# Altium schematic symbol library CUSTOM SCH - Copy.SchLib: 494 symbols (part 2 of 6)
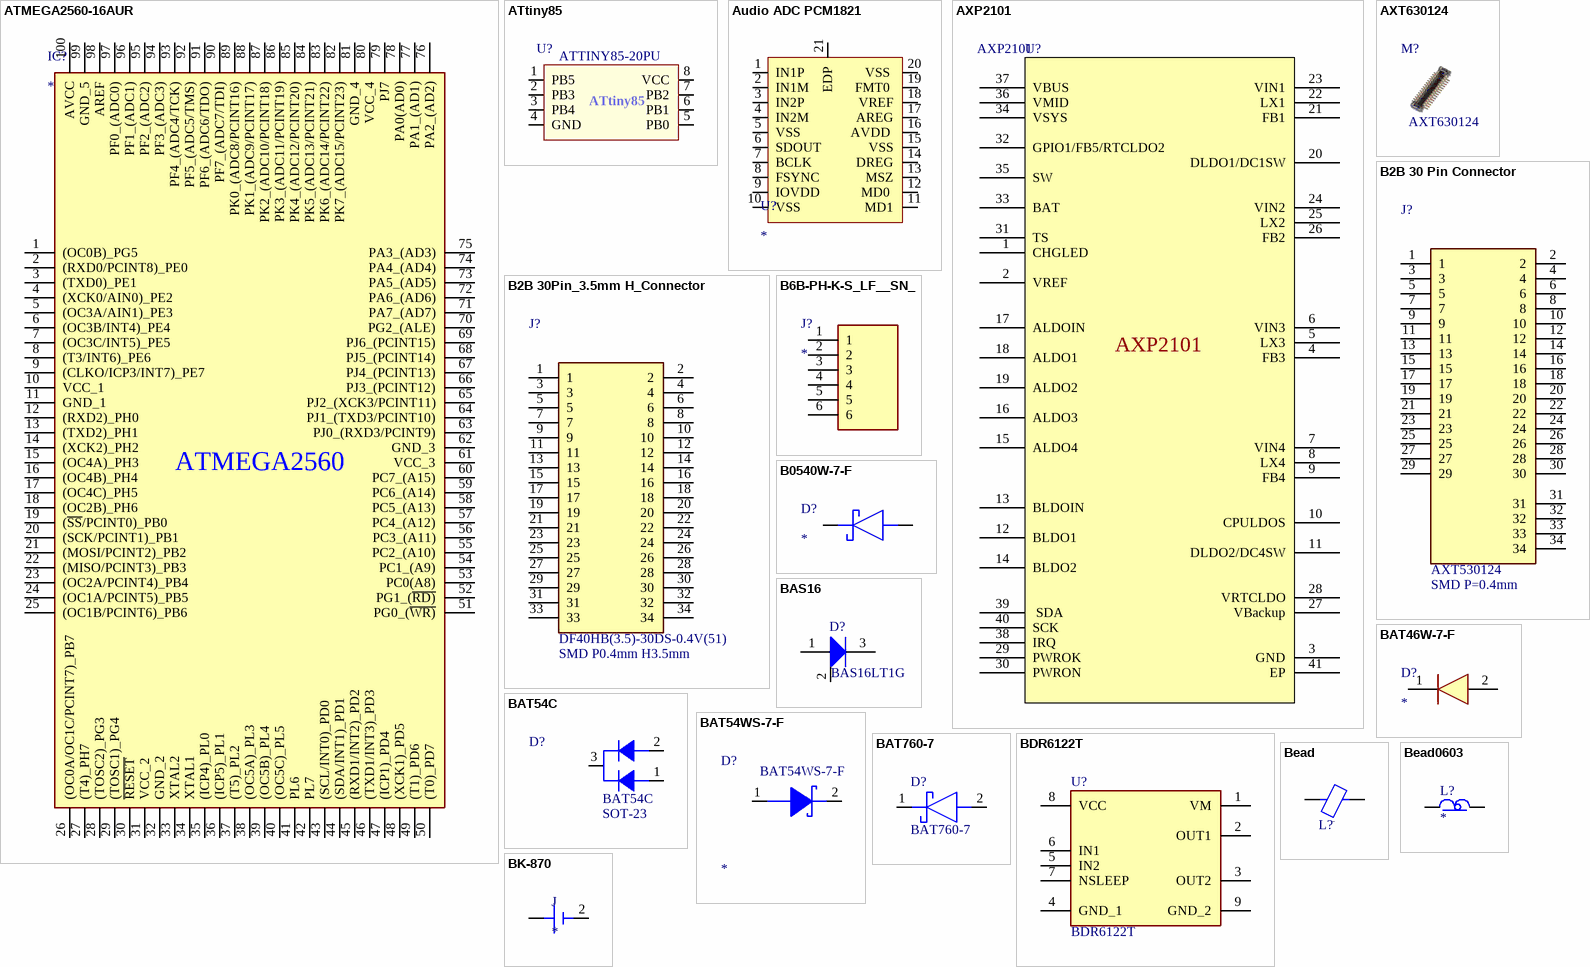
[diagram p50: symbols ATMEGA2560-16AUR to BK-870]

## BAT54WS-7-F
designator D?  Manufacturer Part Number: BAT54WS-7-F
Manufacturer: Multicomp; Max Repetitive Reverse Voltage (Vrrm): 30V; Forward Current: 200mA; Reverse Recovery Time: 5ns; Element Configuration: Single; Forward Voltage: 1V; Max Forward Surge Current (Ifsm): 600mA; Supplier 1: Newark; Stock 1: 3436; Pricing 1: 1=0.147, 10=0.121, 100=0.045, 1000=0.031 (USD); Number of Pins: 2; Max Operating Temperature: 125°C; Packaging: Cut Tape; REACH SVHC: Unknown; Supplier Part Number 1: 65W8470
footprint SOD-323
pins: 1 A1, 2 A2

## BAT760-7
designator D?
Diode Schottky 30V 1A 2Pin SOD323 Diodes Inc BAT760-7, SMT Schottky Diode, 30V 1A, 2-Pin SOD-323; Manufacturer_Name: Diodes Inc.; Allied_Number: 70437639; Geometry.Height: 1.2mm; Manufacturer_Part_Number: BAT760-7; RS Part Number: 7513427P; RS Price/Stock: http://uk.rs-online.com/web/p/products/7513427P; Allied Price/Stock: https://www.alliedelec.com/diodes-inc-bat760-7/70437639/; Mouser Part Number: 621-BAT760-7; Mouser Price/Stock: https://www.mouser.com/Search/Refine.aspx?Keyword=621-BAT760-7; Datasheet Link: https://www.diodes.com/assets/Datasheets/ds30498.pdf
footprint SOD2513X120N
pins: 1 K, 2 A

## BDR6122T
designator U?
1.8A Low-Voltage H-Bridge Driver; Manufacturer_Part_Number: BDR6122T; Case/Package: DFN-8
footprint SON50P200X200X80-9N
footprint DFN8
pins: 1 VM, 2 OUT1, 3 OUT2, 4 GND_1, 5 IN2, 6 IN1, 7 NSLEEP, 8 VCC, 9 GND_2

## Bead
designator L?, comment -
pins: 1, 2

## Bead0603
designator L?
footprint 0603
pins: 1, 2

## BK-870
designator J
Battery Retainer Coin, 10.0mm 1 Cell SMD _SMT_ Tab; MP: BK-870; MF: MPD _Memory; SnapEDA_Link: https://www.snapeda.com/parts/BK-870/MPD%20_Memory%20Protection%20Devices_/view-part/554643/?ref=snap; Availability: Unavailable; Package: DFN-8 MPD; Price: None; Value: *
footprint MPD_BK-870
pins: 1 P, 2 M, 3 P

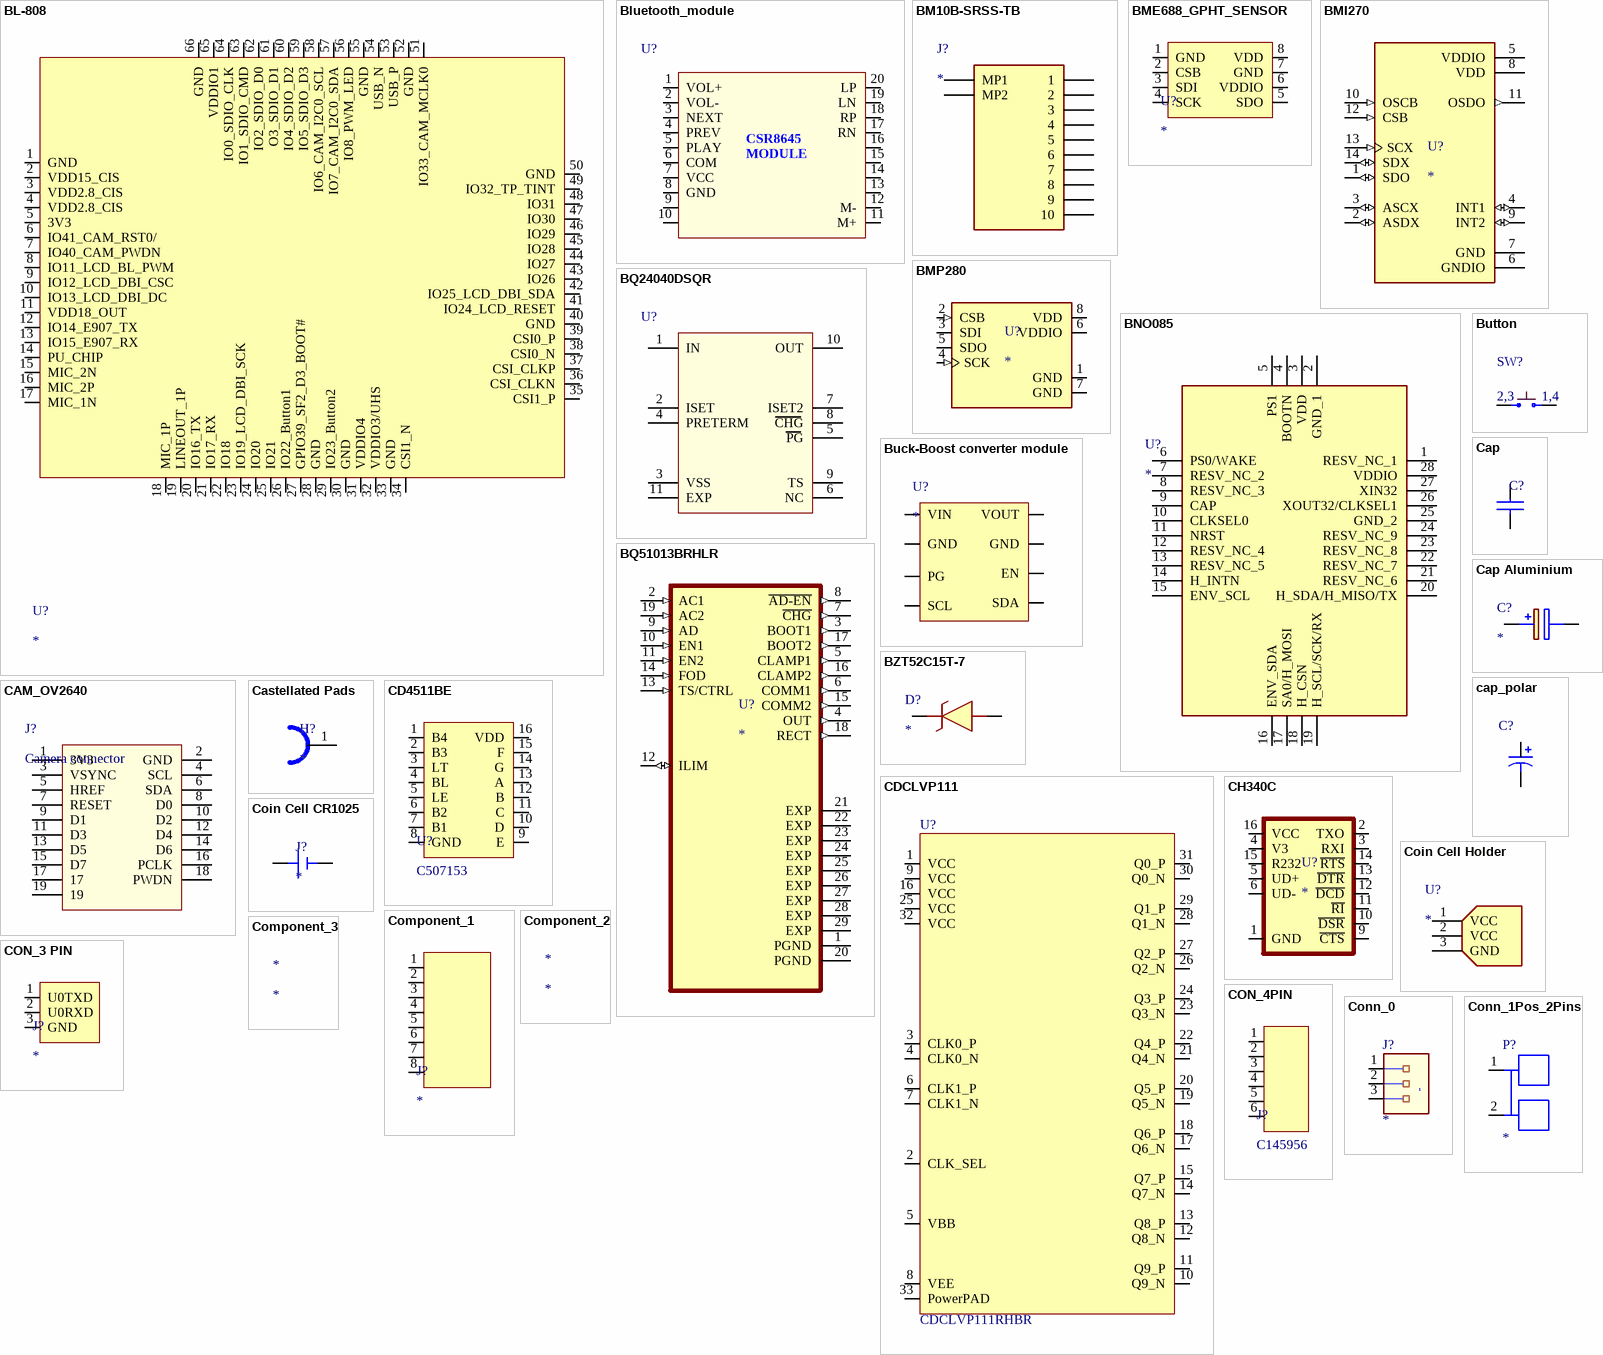
[diagram p7: symbols BL-808 to Conn_1Pos_2Pins]

## BL-808
designator U?
pins: 1 GND, 2 VDD15_CIS, 3 VDD2.8_CIS, 4 VDD2.8_CIS, 5 3V3, 6 IO41_CAM_RST0/, 7 IO40_CAM_PWDN, 8 IO11_LCD_BL_PWM, 9 IO12_LCD_DBI_CSC, 10 IO13_LCD_DBI_DC, 11 VDD18_OUT, 12 IO14_E907_TX, 13 IO15_E907_RX, 14 PU_CHIP, 15 MIC_2N, 16 MIC_2P, 17 MIC_1N, 18 MIC_1P, 19 LINEOUT_1P, 20 IO16_TX, 21 IO17_RX, 22 IO18, 23 IO19_LCD_DBI_SCK, 24 IO20, 25 IO21, 26 IO22_Button1, 27 GPIO39_SF2_D3_BOOT#, 28 GND, 29 IO23_Button2, 30 GND, 31 VDDIO4, 32 VDDIO3/UHS, 33 GND, 34 CSI1_N, 35 CSI1_P, 36 CSI_CLKN, 37 CSI_CLKP, 38 CSI0_N, 39 CSI0_P, 40 GND, 41 IO24_LCD_RESET, 42 IO25_LCD_DBI_SDA, 43 IO26, 44 IO27, 45 IO28, 46 IO29, 47 IO30, 48 IO31, 49 IO32_TP_TINT, 50 GND, 51 IO33_CAM_MCLK0, 52 GND, 53 USB_P, 54 USB_N, 55 GND, 56 IO8_PWM_LED, 57 IO7_CAM_I2C0_SDA, 58 IO6_CAM_I2C0_SCL, 59 IO5_SDIO_D3, 60 IO4_SDIO_D2, 61 O3_SDIO_D1, 62 IO2_SDIO_D0, 63 IO1_SDIO_CMD, 64 IO0_SDIO_CLK, 65 VDDIO1, 66 GND

## Bluetooth_module
designator U?
pins: 1 VOL+, 2 VOL-, 3 NEXT, 4 PREV, 5 PLAY, 6 COM, 7 VCC, 8 GND, 9, 10, 11 M+, 12 M-, 13, 14, 15, 16, 17 RN, 18 RP, 19 LN, 20 LP
text: CSR8645; MODULE

## BM10B-SRSS-TB
designator J?
10 Pin, 1mm Pitch, Receptable Connector; Manufacturer Part Number: BM10B-SRSS-TB (LF)(SN); Case/Package: SMD 1mm Pitch
footprint BM10BSRSSTBLFSN
pins: 1, 2, 3, 4, 5, 6, 7, 8, 9, 10, MP1, MP2

## BME688_GPHT_SENSOR
designator U?
Gas, Humidity, Pressure, Temperature Sensor I²C, SPI Output; ParamManufacturer Part Numbereter 2: BME688; Value: *
footprint BME688_SENSOR
pins: 1 GND, 2 CSB, 3 SDI, 4 SCK, 5 SDO, 6 VDDIO, 7 GND, 8 VDD

## BMI270
designator U?
Accelerometer, Gyroscope, 6 Axis Sensor IÂ²C, SPI Output; Manufacturer Part Number: BMI270; Case/Package: LGA-14 Bosch Sensortec
footprint BMI270
pins: 1 SDO (io), 2 ASDX (io), 3 ASCX (io), 4 INT1 (io), 5 VDDIO (power), 6 GNDIO (power), 7 GND (power), 8 VDD (power), 9 INT2 (io), 10 OSCB (in), 11 OSDO (out), 12 CSB (in), 13 SCX (in), 14 SDX (io)

## BMP280
designator U?
Pressure Sensor 4.35PSI ~ 15.95PSI _30kPa ~ 110kPa_ Absolute 16b 8-SMD; Manufacturer Part Number: BMP280; Case/Package: SMD-8 Bosch Sensortec
footprint XDCR_BMP280
footprint BMP280
pins: 1 GND (power), 2 CSB (in), 3 SDI (io), 4 SCK (in), 5 SDO (io), 6 VDDIO (power), 7 GND (power), 8 VDD (power)

## BNO085
designator U?
IMU ACCEL/GYRO/MAG I2C 32BIT; Manufacturer_Part_Number: BNO085; Case/Package: SMD
footprint BNO085
pins: 1 RESV_NC_1, 2 GND_1, 3 VDD, 4 BOOTN, 5 PS1, 6 PS0/WAKE, 7 RESV_NC_2, 8 RESV_NC_3, 9 CAP, 10 CLKSEL0, 11 NRST, 12 RESV_NC_4, 13 RESV_NC_5, 14 H_INTN, 15 ENV_SCL, 16 ENV_SDA, 17 SA0/H_MOSI, 18 H_CSN, 19 H_SCL/SCK/RX, 20 H_SDA/H_MISO/TX, 21 RESV_NC_6, 22 RESV_NC_7, 23 RESV_NC_8, 24 RESV_NC_9, 25 GND_2, 26 XOUT32/CLKSEL1, 27 XIN32, 28 VDDIO

## BQ24040DSQR
designator U?  (value not drawn)
IC BATT CHG LI-ION 1 CELL 10SON; Manufacturer: Texas Instruments; Manufacturer Part Number: BQ24040DSQR; Output Current: 800mA; Max Power Dissipation: 1.66W; Output Voltage: 4.2V; Min Supply Voltage: 4.75V; Max Supply Voltage: 28V; Min Input Voltage: 3.5V; Number of Cells: 1; Operating Supply Current: 800uA; Max Charge Current: 1A; Fault Protection: Over Voltage,Over Temperature,Short Circuit; Supplier 1: Digi-Key; Stock 1: 20950; Pricing 1: 1=1.26, 10=1.124, 25=1.0672, 100=0.8194, 250=0.7241, 500=0.686, 1000=0.5335 (USD); Number of Pins: 10; Contact Plating: Gold; Min Operating Temperature: -40°C; Max Operating Temperature: 85°C; Packaging: Tape and Reel; Package Quantity: 3000; Battery Pack Voltage: 4.2V; REACH SVHC: No SVHC; Lead Free: Lead Free; ComponentLink1URL: http://www.ti.com/lit/pdf/slyt420?src-supplier=Digi-Key; ComponentLink1Description: http://www.ti.com/lit/pdf/slyt420?src-supplier=Digi-Key; ComponentLink2URL: http://www.ti.com/general/docs/suppproductinfo.tsp?distId=10&gotoUrl=http%3A%2F%2Fwww.ti.com%2Flit%2Fgpn%2Fbq24040&src-supplier=Digi-Key; ComponentLink2Description: http://www.ti.com/general/docs/suppproductinfo.tsp?distId=10&gotoUrl=http%3A%2F%2Fwww.ti.com%2Flit%2Fgpn%2Fbq24040&src-supplier=Digi-Key; ComponentLink3URL: http://datasheet.iiic.cc/texas_instruments/BQ24040DSQR.pdf?src-supplier=IIIC; ComponentLink3Description: http://datasheet.iiic.cc/texas_instruments/BQ24040DSQR.pdf?src-supplier=IIIC; Supplier Part Number 1: 296-37142-1-ND
footprint 10-WFDFN
pins: 1 IN, 2 ISET, 3 VSS, 4 PRETERM, 5 PG, 6 NC, 7 ISET2, 8 CHG, 9 TS, 10 OUT, 11 EXP

## BQ51013BRHLR
designator U?
WPC 1.1 Compatible Fully integrated Wireless power Receiver IC 20-VQFN 0 to 125; Manufacturer Part Number: BQ51013BRHLR; Case/Package: VQFN-20 Texas Instruments
footprint MSP430FR2522IRHLR (Wireless Charger IC)
pins: 1 PGND (power), 2 AC1 (in), 3 BOOT1 (out), 4 OUT (out), 5 CLAMP1 (out), 6 COMM1 (out), 7 ~{CHG} (out), 8 ~{AD-EN} (out), 9 AD (in), 10 EN1 (in), 11 EN2 (in), 12 ILIM (io), 13 TS/CTRL (in), 14 FOD (in), 15 COMM2 (out), 16 CLAMP2 (out), 17 BOOT2 (out), 18 RECT (out), 19 AC2 (in), 20 PGND (power), 21 EXP (power), 22 EXP (power), 23 EXP (power), 24 EXP (power), 25 EXP (power), 26 EXP (power), 27 EXP (power), 28 EXP (power), 29 EXP (power)

## Buck-Boost converter module
designator U?
Buck-Boost converter O/p 3.3V; Case/Package: SMD; Manufacturer part Number: *; Value: *
footprint FAN49100 Module (Buck Boost Module)
pins: 1 VIN (power) "Input", 2 GND (power) "Ground", 3 PG "Power Good", 4 EN "Enable", 5 GND (power) "Ground", 6 VOUT (power) "Output", 7 SCL, 8 SDA "Enable"

## Button
designator SW?, comment UK-B0206-G5-160-JZ  (value not drawn)
SPST 4.5*4.5*5 Tactile Switches RoHS; MF: TE Connectivity; Contact_Current_Rating: 50 mA; Configuration_Pole-Throw: Single Pole - Single Throw; Case/Package: 4.5*4.5*5; TE_purchase_URL: https://www.te.com/usa-en/product-1825910-6.html?te_bu=Cor&te_type=disp&te_campaign=seda_glo_cor-seda-global-disp-prtnr-fy19-seda-model-bom-cta_sma-317_1&elqCampaignId=32493; Availability: Unavailable; EU_RoHS_Compliance: Compliant; Manufacturer Part Number: UK-B0206-G5-160-JZ; SnapEDA_Link: https://www.snapeda.com/parts/1825910-6/TE%20Connectivity%20ALCOSWITCH%20Switches/view-part/?ref=snap; Price: None; Value: *
footprint Button   4.5*4.5*5
pins: 1, 2, 3, 4
text: 2,3; 1,4

## BZT52C15T-7
designator D?
Diodes Inc BZT52C15T-7 Zener Diode; Manufacturer Part Number: BZT52C15T-7; Case/Package: SOD-123
footprint SOD-123
pins: A, K

## CAM_OV2640
designator J?, comment Camera connector
Camera connector TH
pins: 1 3V3, 2 GND, 3 VSYNC, 4 SCL, 5 HREF, 6 SDA, 7 RESET, 8 D0, 9 D1, 10 D2, 11 D3, 12 D4, 13 D5, 14 D6, 15 D7, 16 PCLK, 17, 18 PWDN, 19

## Cap
designator C?
CAP CER uF 10V X5R 0402; Manufacturer Part Number: *; Value: *; Voltage: *; Dielectric: *; Case/Package: *
simulation model CAP (Capacitor)
signal-integrity model Cap Pol
pins: 1, 2
1 alternate drawing of the same symbol

## Cap Aluminium
designator C?
uF, V SMD,6.3x7.7mm Aluminum Electrolytic Capacitors - SMD ROHS; Manufacturer Part Number: *; Value: *; Case/Package: SMD,6.3x7.7mm; ComponentLink1URL: http://industrial.panasonic.com/www-data/pdf/ABA0000/ABA0000CE3.pdf?src-supplier=Avnet; ComponentLink1Description: http://industrial.panasonic.com/www-data/pdf/ABA0000/ABA0000CE3.pdf?src-supplier=Avnet; ComponentLink2URL: https://www.alliedelec.com/m/d/fd6499687c6391717d5741690c1b5331.pdf?src-supplier=Allied+Electronics; ComponentLink2Description: https://www.alliedelec.com/m/d/fd6499687c6391717d5741690c1b5331.pdf?src-supplier=Allied+Electronics; ComponentLink3URL: http://www.farnell.com/datasheets/2059978.pdf?src-supplier=Element14; ComponentLink3Description: http://www.farnell.com/datasheets/2059978.pdf?src-supplier=Element14; ComponentLink4URL: http://www.farnell.com/datasheets/2059978.pdf?src-supplier=Farnell; ComponentLink4Description: http://www.farnell.com/datasheets/2059978.pdf?src-supplier=Farnell; Voltage: *
footprint Aluminium Capacitor  SMD (SMD 6.3mm*7.7mm)
pins: 1, 2

## cap_polar
designator C?  (value not drawn)
CAP CER uF 10V X5R 0402; Manufacturer Part Number: *; Value: *; Case/Package: *; Voltage: *; Dielectric: *
pins: 1 +, 2

## Castellated Pads
designator H?
Castellated mounting holes; Diameter: 1mm; Length: 1mm
footprint Castellated_pad (Castellated mounting holes)
pins: 1

## CD4511BE
designator U?, comment C507153
DIP-16 LED Display Drivers ROHS; Manufacturer Part Number: CD4511BE; Case/Package: DIP-16; ComponentLink1Description: New link
footprint CD4511BE_  DIP-16
pins: 1 B4, 2 B3, 3 LT, 4 BL, 5 LE, 6 B2, 7 B1, 8 GND, 9 E, 10 D, 11 C, 12 B, 13 A, 14 G, 15 F, 16 VDD

## CDCLVP111
designator U?  Manufacturer Part Number: CDCLVP111RHBR  (hidden comment: *)
Clock Fanout Buffer (Distribution), Multiplexer IC 1:10 3.5 GHz 32-VFQFN Exposed Pad; Case/Package: VQFN-32-EP(5x5)
footprint CDCLVP111RHBR
footprint CDCLVP111RHBR
pins: 1 VCC, 2 CLK_SEL, 3 CLK0_P, 4 CLK0_N, 5 VBB, 6 CLK1_P, 7 CLK1_N, 8 VEE, 9 VCC, 10 Q9_N, 11 Q9_P, 12 Q8_N, 13 Q8_P, 14 Q7_N, 15 Q7_P, 16 VCC, 17 Q6_N, 18 Q6_P, 19 Q5_N, 20 Q5_P, 21 Q4_N, 22 Q4_P, 23 Q3_N, 24 Q3_P, 25 VCC, 26 Q2_N, 27 Q2_P, 28 Q1_N, 29 Q1_P, 30 Q0_N, 31 Q0_P, 32 VCC, 33 PowerPAD

## CH340C
designator U?
USB to serial chip CH340; Manufacturer Part Number: CH340C; Package: SMD; Value: *
footprint SO016
pins: 1 GND, 2 TXO, 3 RXI, 4 V3, 5 UD+, 6 UD-, 9 ~{CTS}, 10 ~{DSR}, 11 ~{RI}, 12 ~{DCD}, 13 ~{DTR}, 14 ~{RTS}, 15 R232, 16 VCC

## Coin Cell CR1025
designator J?
Battery Retainer Coin, 10.0mm 1 Cell SMD _SMT_ Tab; MP: BK-870; MF: MPD _Memory; SnapEDA_Link: https://www.snapeda.com/parts/BK-870/MPD%20_Memory%20Protection%20Devices_/view-part/554643/?ref=snap; Availability: Unavailable; Package: DFN-8 MPD; Price: None; Value: *
footprint MPD_BK-870
pins: 1 P, 2 M, 3 P

## Coin Cell Holder
designator U?
Coin Cell Battery Holders Linx CR2032 Battery Holder; Manufacturer Part Number: BAT-HLD-001; Case/Package: SMD
footprint BATHLD001
footprint COIn CELL HOLDER (CR2032)
pins: 1 VCC, 2 VCC, 3 GND

## Component_1
designator J?
Parameter 1: *; Parameter 2: *
pins: 1, 2, 3, 4, 5, 6, 7, 8

## Component_2
designator *

## Component_3
designator *

## CON_3 PIN
designator J?
pins: 1 U0TXD, 2 U0RXD, 3 GND

## CON_4PIN
designator J?, comment C145956
1x4P SH 1 1mm 4 Phosphor coppe SMD,P=1mm Wire To Board / Wire To Wire Connector ROHS; Manufacturer Part Number: C145956; VALUE: *
pins: 1 8, 2 9, 3 10, 4 11, 5, 6

## Conn_0
designator J?
pins: 1, 2, 3

## Conn_1Pos_2Pins
designator P?
pins: 1, 2

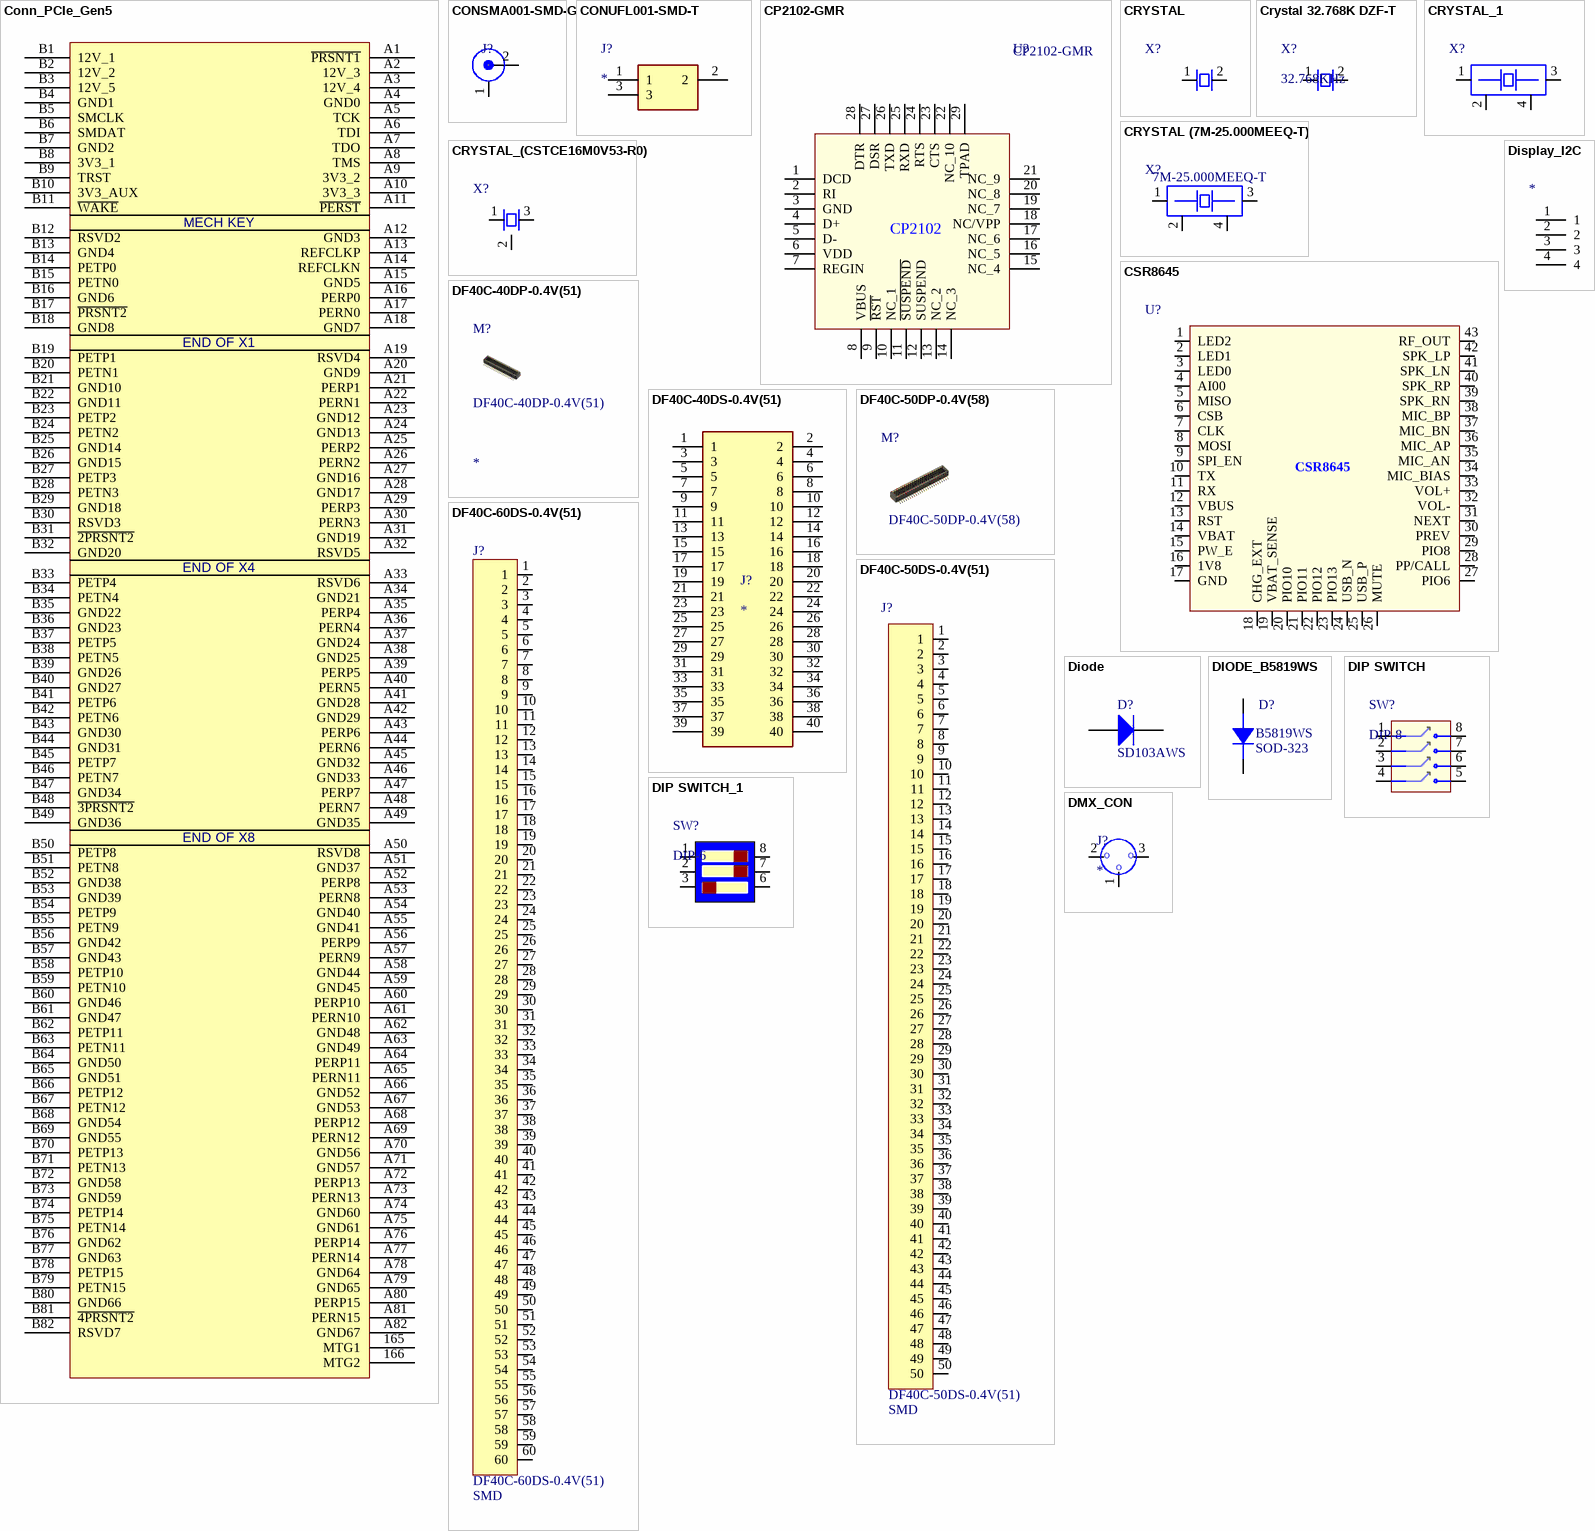
[diagram p8: symbols Conn_PCIe_Gen5 to DMX_CON]

## Conn_PCIe_Gen5
designator J?
PCI Express® Gen 5 Card Edge Connectors, Vertical, Surface Mount, 164 Position; Manufacturer Part Number: 10146070-113Y0LF
pins: 165 MTG1, 166 MTG2, A1 ~{PRSNT1}, A2 12V_3, A3 12V_4, A4 GND0, A5 TCK, A6 TDI, A7 TDO, A8 TMS, A9 3V3_2, A10 3V3_3, A11 ~{PERST}, A12 GND3, A13 REFCLKP, A14 REFCLKN, A15 GND5, A16 PERP0, A17 PERN0, A18 GND7, A19 RSVD4, A20 GND9, A21 PERP1, A22 PERN1, A23 GND12, A24 GND13, A25 PERP2, A26 PERN2, A27 GND16, A28 GND17, A29 PERP3, A30 PERN3, A31 GND19, A32 RSVD5, A33 RSVD6, A34 GND21, A35 PERP4, A36 PERN4, A37 GND24, A38 GND25, A39 PERP5, A40 PERN5, A41 GND28, A42 GND29, A43 PERP6, A44 PERN6, A45 GND32, A46 GND33, A47 PERP7, A48 PERN7, A49 GND35, A50 RSVD8, A51 GND37, A52 PERP8, A53 PERN8, A54 GND40, A55 GND41, A56 PERP9, A57 PERN9, A58 GND44, A59 GND45, A60 PERP10, A61 PERN10, A62 GND48, A63 GND49, A64 PERP11, A65 PERN11, A66 GND52, A67 GND53, A68 PERP12, A69 PERN12, A70 GND56, A71 GND57, A72 PERP13, A73 PERN13, A74 GND60, A75 GND61, A76 PERP14, A77 PERN14, A78 GND64, A79 GND65, A80 PERP15, A81 PERN15, A82 GND67, B1 12V_1, B2 12V_2, B3 12V_5, B4 GND1, B5 SMCLK, B6 SMDAT, B7 GND2, B8 3V3_1, B9 TRST, B10 3V3_AUX, B11 ~{WAKE}, B12 RSVD2, B13 GND4, B14 PETP0, B15 PETN0, B16 GND6, B17 ~{PRSNT2}, B18 GND8, B19 PETP1, B20 PETN1, B21 GND10, B22 GND11, B23 PETP2, B24 PETN2, B25 GND14, B26 GND15, B27 PETP3, B28 PETN3, B29 GND18, B30 RSVD3, B31 ~{2PRSNT2}, B32 GND20, B33 PETP4, B34 PETN4, B35 GND22, B36 GND23, B37 PETP5, B38 PETN5, B39 GND26, B40 GND27, B41 PETP6, B42 PETN6, B43 GND30, B44 GND31, B45 PETP7, B46 PETN7, B47 GND34, B48 ~{3PRSNT2}, B49 GND36, B50 PETP8, B51 PETN8, B52 GND38, B53 GND39, B54 PETP9, B55 PETN9, B56 GND42, B57 GND43, B58 PETP10, B59 PETN10, B60 GND46, B61 GND47, B62 PETP11, B63 PETN11, B64 GND50, B65 GND51, B66 PETP12, B67 PETN12, B68 GND54, B69 GND55, B70 PETP13, B71 PETN13, B72 GND58, B73 GND59, B74 PETP14, B75 PETN14, B76 GND62, B77 GND63, B78 PETP15, B79 PETN15, B80 GND66, B81 ~{4PRSNT2}, B82 RSVD7
text: MECH KEY; END OF X1; END OF X4; END OF X8

## CONSMA001-SMD-G
designator J?
Manufacturer: Linx; Manufacturer Part Number: CONSMA001-SMD-G; Plating: Gold; Body Material: Brass; Dielectric Material: PTFE; Impedance: 50R; Gender: Female; Connector Type: SMA,Socket; Supplier 1: Digi-Key; Stock 1: 3099; Pricing 1: 1=3.12, 25=2.82, 100=2.69, 500=2.616 (USD); Mount: Surface Mount; Case/Package: SMA; Contact Plating: Gold; Contact Material: Copper; Body Plating: Gold; Housing Color: Gold; Shell Plating: Gold; Min Operating Temperature: -65°C; Max Operating Temperature: 165°C; Package Quantity: 100; Packaging: Bulk; Fastening Type: Threaded; Termination: Solder; Orientation: Vertical; Lead Free: Lead Free; ComponentLink1URL: http://www.mouser.com/ds/2/238/consma001-smd-21851.pdf?src-supplier=Mouser; ComponentLink1Description: http://www.mouser.com/ds/2/238/consma001-smd-21851.pdf?src-supplier=Mouser; ComponentLink2URL: https://media.digikey.com/pdf/Data%20Sheets/Linx%20Technologies%20PDFs/RFConnector_Overview_Guide_2-19-15.pdf?src-supplier=Digi-Key; ComponentLink2Description: https://media.digikey.com/pdf/Data%20Sheets/Linx%20Technologies%20PDFs/RFConnector_Overview_Guide_2-19-15.pdf?src-supplier=Digi-Key; Supplier Part Number 1: CONSMA001-SMD-G-ND
footprint CONSMA001SMDG
pins: 1, 2

## CONUFL001-SMD-T
designator J?
Connector; Manufacturer: Linx; Manufacturer Part Number: CONUFL001-SMD-T; Body Material: Copper Alloy; Body Plating: Gold; Dielectric Material: Polymer; Connector Type: Male Pin; Impedance: 50R; Max Frequency: 6GHz; Number of Ports: 1; Supplier 1: Digi-Key; Stock 1: 22500; Pricing 1: 2500=0.34, 12500=0.2976 (USD); Mount: Surface Mount; Contact Plating: Gold; Contact Material: Brass; Housing Color: White; Min Operating Temperature: -40°C; Max Operating Temperature: 90°C; Fastening Type: Snap; Packaging: Tape and Reel; Termination: Solder; ComponentLink1URL: https://media.digikey.com/pdf/Data%20Sheets/Linx%20Technologies%20PDFs/CONUFL001-SMD_T_Dwg_RevB_5-15-17.pdf?src-supplier=Digi-Key; ComponentLink1Description: https://media.digikey.com/pdf/Data%20Sheets/Linx%20Technologies%20PDFs/CONUFL001-SMD_T_Dwg_RevB_5-15-17.pdf?src-supplier=Digi-Key; Supplier Part Number 1: CONUFL001-SMD-TTR-ND
footprint CONUFL001-SMD
pins: 1, 2, 3

## CP2102-GMR
designator U?
I/O Controller Interface IC USB-TO-UART BRIDGE, qfn-28; Manufacturer Part Number: CP2102-GMR; Case/Package: QFN-28
footprint QFN50P500X500X100-29N-D
pins: 1 DCD, 2 RI, 3 GND, 4 D+, 5 D-, 6 VDD, 7 REGIN, 8 VBUS, 9 ~{RST}, 10 NC_1, 11 ~{SUSPEND}, 12 SUSPEND, 13 NC_2, 14 NC_3, 15 NC_4, 16 NC_5, 17 NC_6, 18 NC/VPP, 19 NC_7, 20 NC_8, 21 NC_9, 22 NC_10, 23 CTS, 24 RTS, 25 RXD, 26 TXD, 27 DSR, 28 DTR, 29 TPAD
text: CP2102

## CRYSTAL
designator X?
pins: 1, 2

## Crystal 32.768K DZF-T
designator X?, comment 32.768KHz
Crystals 32.768KHz 20ppm 12.5pF; Manufacturer_Part_Number: 9HT12-32.768KDZF-T; Value: 32.768KHz; Case/Package: SMD/SMT
footprint 9HT1232768KDZFT (Crystal 32.768kHz)
pins: 1 CRYSTAL_1, 2 CRYSTAL_2

## CRYSTAL (7M-25.000MEEQ-T)
designator X?  Manufacturer Part Number: 7M-25.000MEEQ-T  (hidden comment: *)
25MHz ±10ppm Crystal 10pF 60 Ohms 4-SMD, No Lead; Case/Package: SMD/SMT; ComponentLink1URL: https://www.verical.com/server-webapp/html/getDatasheet?partID=757227&src-supplier=Verical; ComponentLink1Description: https://www.verical.com/server-webapp/html/getDatasheet?partID=757227&src-supplier=Verical; ComponentLink2URL: http://www.txccrystal.com/images/pdf/7m-accuracy.pdf?src-supplier=Digi-Key; ComponentLink2Description: http://www.txccrystal.com/images/pdf/7m-accuracy.pdf?src-supplier=Digi-Key; ComponentLink3URL: http://www.farnell.com/datasheets/1794111.pdf?src-supplier=Element14; ComponentLink3Description: http://www.farnell.com/datasheets/1794111.pdf?src-supplier=Element14; ComponentLink4URL: http://www.mouser.com/ds/2/417/7m-11184.pdf?src-supplier=Mouser; ComponentLink4Description: http://www.mouser.com/ds/2/417/7m-11184.pdf?src-supplier=Mouser
footprint XTAL_432-00011
pins: 1, 2, 3, 4

## CRYSTAL_1
designator X?
ComponentLink1URL: https://www.verical.com/server-webapp/html/getDatasheet?partID=757227&src-supplier=Verical; ComponentLink1Description: https://www.verical.com/server-webapp/html/getDatasheet?partID=757227&src-supplier=Verical; ComponentLink2URL: http://www.txccrystal.com/images/pdf/7m-accuracy.pdf?src-supplier=Digi-Key; ComponentLink2Description: http://www.txccrystal.com/images/pdf/7m-accuracy.pdf?src-supplier=Digi-Key; ComponentLink3URL: http://www.farnell.com/datasheets/1794111.pdf?src-supplier=Element14; ComponentLink3Description: http://www.farnell.com/datasheets/1794111.pdf?src-supplier=Element14; ComponentLink4URL: http://www.mouser.com/ds/2/417/7m-11184.pdf?src-supplier=Mouser; ComponentLink4Description: http://www.mouser.com/ds/2/417/7m-11184.pdf?src-supplier=Mouser
pins: 1, 2, 3, 4

## CRYSTAL_(CSTCE16M0V53-R0)
designator X?, comment CSTCE16M0V53-R0  (value not drawn)
16MHz ±0.5% 15pF SMD-3213_3P Ceramic Resonators RoHS; Case/Package: SMD-3213_3P; Manufacturer Part Number: CSTCE16M0V53-R0; Value: 16MHz
footprint SMD-3213_3P
pins: 1, 2, 3

## CSR8645
designator U?  (value not drawn)
pins: 1 LED2, 2 LED1, 3 LED0, 4 AI00, 5 MISO, 6 CSB, 7 CLK, 8 MOSI, 9 SPI_EN, 10 TX, 11 RX, 12 VBUS, 13 RST, 14 VBAT, 15 PW_E, 16 1V8, 17 GND, 18 CHG_EXT, 19 VBAT_SENSE, 20 PIO10, 21 PIO11, 22 PIO12, 23 PIO13, 24 USB_N, 25 USB_P, 26 MUTE, 27 PIO6, 28 PP/CALL, 29 PIO8, 30 PREV, 31 NEXT, 32 VOL-, 33 VOL+, 34 MIC_BIAS, 35 MIC_AN, 36 MIC_AP, 37 MIC_BN, 38 MIC_BP, 39 SPK_RN, 40 SPK_RP, 41 SPK_LN, 42 SPK_LP, 43 RF_OUT

## DF40C-40DP-0.4V(51)
designator M?  Manufacturer Part Number: DF40C-40DP-0.4V(51)  (mechanical)
CONN PLUG 40POS SMD GOLD; Case/Package: SMD

## DF40C-40DS-0.4V(51)
designator J?
Connectors, Interconnects / Rectangular Connectors - Arrays, Edge Type, Mezzanine (Board to Board); Manufacturer Part Number: DF40C-40DS-0.4V(51)
footprint DF40C-40DS-0.4V(51)
pins: 1, 2, 3, 4, 5, 6, 7, 8, 9, 10, 11, 12, 13, 14, 15, 16, 17, 18, 19, 20, 21, 22, 23, 24, 25, 26, 27, 28, 29, 30, 31, 32, 33, 34, 35, 36, 37, 38, 39, 40

## DF40C-50DP-0.4V(58)
designator M?  Manufacturer Part Number: DF40C-50DP-0.4V(58)  (hidden comment: *)  (mechanical)
Mating Conn of DF40C-50DS-0.4V(51)

## DF40C-50DS-0.4V(51)
designator J?  Manufacturer Part Number: DF40C-50DS-0.4V(51)  Case/Package: SMD  (hidden comment: *)
50 Position Connector Receptacle, Center Strip Contacts Surface Mount Gold
footprint DF40C-50DS-04V(51)
pins: 1, 2, 3, 4, 5, 6, 7, 8, 9, 10, 11, 12, 13, 14, 15, 16, 17, 18, 19, 20, 21, 22, 23, 24, 25, 26, 27, 28, 29, 30, 31, 32, 33, 34, 35, 36, 37, 38, 39, 40, 41, 42, 43, 44, 45, 46, 47, 48, 49, 50

## DF40C-60DS-0.4V(51)
designator J?  Manufacturer Part Number: DF40C-60DS-0.4V(51)  Case/Package: SMD
60 Position Connector Receptacle 0.4 mm pitch
footprint DF40C-60DS-0.4V(51)
footprint DF40C-60DS-0.4V(51)
pins: 1, 2, 3, 4, 5, 6, 7, 8, 9, 10, 11, 12, 13, 14, 15, 16, 17, 18, 19, 20, 21, 22, 23, 24, 25, 26, 27, 28, 29, 30, 31, 32, 33, 34, 35, 36, 37, 38, 39, 40, 41, 42, 43, 44, 45, 46, 47, 48, 49, 50, 51, 52, 53, 54, 55, 56, 57, 58, 59, 60

## Diode
designator D?, comment SD103AWS
Diode Schottky 40V 0.35A Automotive 2-Pin SOD-323 T/R; Manufacturer Part Number: SD103AWS-7-F; ComponentLink1URL: https://datasheet.ciiva.com/34302/1541917-34302427.pdf?src-supplier=Jameco; ComponentLink1Description: https://datasheet.ciiva.com/34302/1541917-34302427.pdf?src-supplier=Jameco; ComponentLink2URL: https://datasheet.ciiva.com/17068/0900766b80e30fe8-17068236.pdf?src-supplier=Allied+Electronics; ComponentLink2Description: https://datasheet.ciiva.com/17068/0900766b80e30fe8-17068236.pdf?src-supplier=Allied+Electronics; ComponentLink3URL: https://datasheet.ciiva.com/15144/getdatasheetpartid-89223-15144637.pdf?src-supplier=Verical; ComponentLink3Description: https://datasheet.ciiva.com/15144/getdatasheetpartid-89223-15144637.pdf?src-supplier=Verical; ComponentLink4URL: https://datasheet.ciiva.com/912/ds30101-912900.pdf?src-supplier=Digi-Key; ComponentLink4Description: https://datasheet.ciiva.com/912/ds30101-912900.pdf?src-supplier=Digi-Key; ComponentLink5URL: https://datasheet.ciiva.com/912/ds30101-912901.pdf?src-supplier=Digi-Key; ComponentLink5Description: https://datasheet.ciiva.com/912/ds30101-912901.pdf?src-supplier=Digi-Key; ComponentLink6URL: https://datasheet.ciiva.com/16476/ds30101-16476773.pdf?src-supplier=Avnet+Asia; ComponentLink6Description: https://datasheet.ciiva.com/16476/ds30101-16476773.pdf?src-supplier=Avnet+Asia; ComponentLink7URL: https://datasheet.ciiva.com/912/ds30101-912902.pdf?src-supplier=Digi-Key; ComponentLink7Description: https://datasheet.ciiva.com/912/ds30101-912902.pdf?src-supplier=Digi-Key; ComponentLink8URL: https://datasheet.ciiva.com/22695/1911709-22695846.pdf?src-supplier=Element14; ComponentLink8Description: https://datasheet.ciiva.com/22695/1911709-22695846.pdf?src-supplier=Element14; ComponentLink9URL: https://datasheet.ciiva.com/7964/ds30101-7964328.pdf?src-supplier=Element14; ComponentLink9Description: https://datasheet.ciiva.com/7964/ds30101-7964328.pdf?src-supplier=Element14; ComponentLink10URL: https://datasheet.ciiva.com/8301/ds30101-8301401.pdf?src-supplier=Avnet; ComponentLink10Description: https://datasheet.ciiva.com/8301/ds30101-8301401.pdf?src-supplier=Avnet; ComponentLink11URL: https://datasheet.ciiva.com/25945/ds30101-25945898.pdf?src-supplier=Avnet+Europe; ComponentLink11Description: https://datasheet.ciiva.com/25945/ds30101-25945898.pdf?src-supplier=Avnet+Europe; Case/Package: SOD-323
simulation model DIODE (Diode)
signal-integrity model Diode
footprint SOD-323
pins: A, K

## DIODE_B5819WS
designator D?  Manufacturer Part Number: B5819WS  Case/Package: SOD-323
Schottky Barrier£¬B5819WS SOD-323
footprint SOD-323
pins: 1 A, 2 K

## DIP SWITCH
designator SW?, comment DIP-8
4 Way 2.54MM DIP switch; Manufacturer Part Number: Product Code 5841; Value: SUNROM; Case/Package: DIP-8
footprint DIP-8 SWITCH
pins: 1, 2, 3, 4, 5, 6, 7, 8

## DIP SWITCH_1
designator SW?, comment DIP-6
3 Way 2.54MM DIP switch; Manufacturer Part Number: Product Code 5841; Value: SUNROM; Case/Package: DIP-8
footprint DIP-8 SWITCH
pins: 1, 2, 3, 6, 7, 8

## Display_I2C
designator *  (value not drawn)
pins: 1, 2, 3, 4

## DMX_CON
designator J?
pins: 1, 2, 3
